# Altium footprint library CADTlink.PcbLib: 143 footprints (part 1 of 9)
Each footprint in its own frame and in the unit in brackets; x right, y up, seen from the top. Pads: shape width x height; smd on the part's side, far side on the other; paste and mask are expansions set on the pad; w line width, h text height; cw(c..) or ccw(c..) is an arc to the next point about the centre after c.
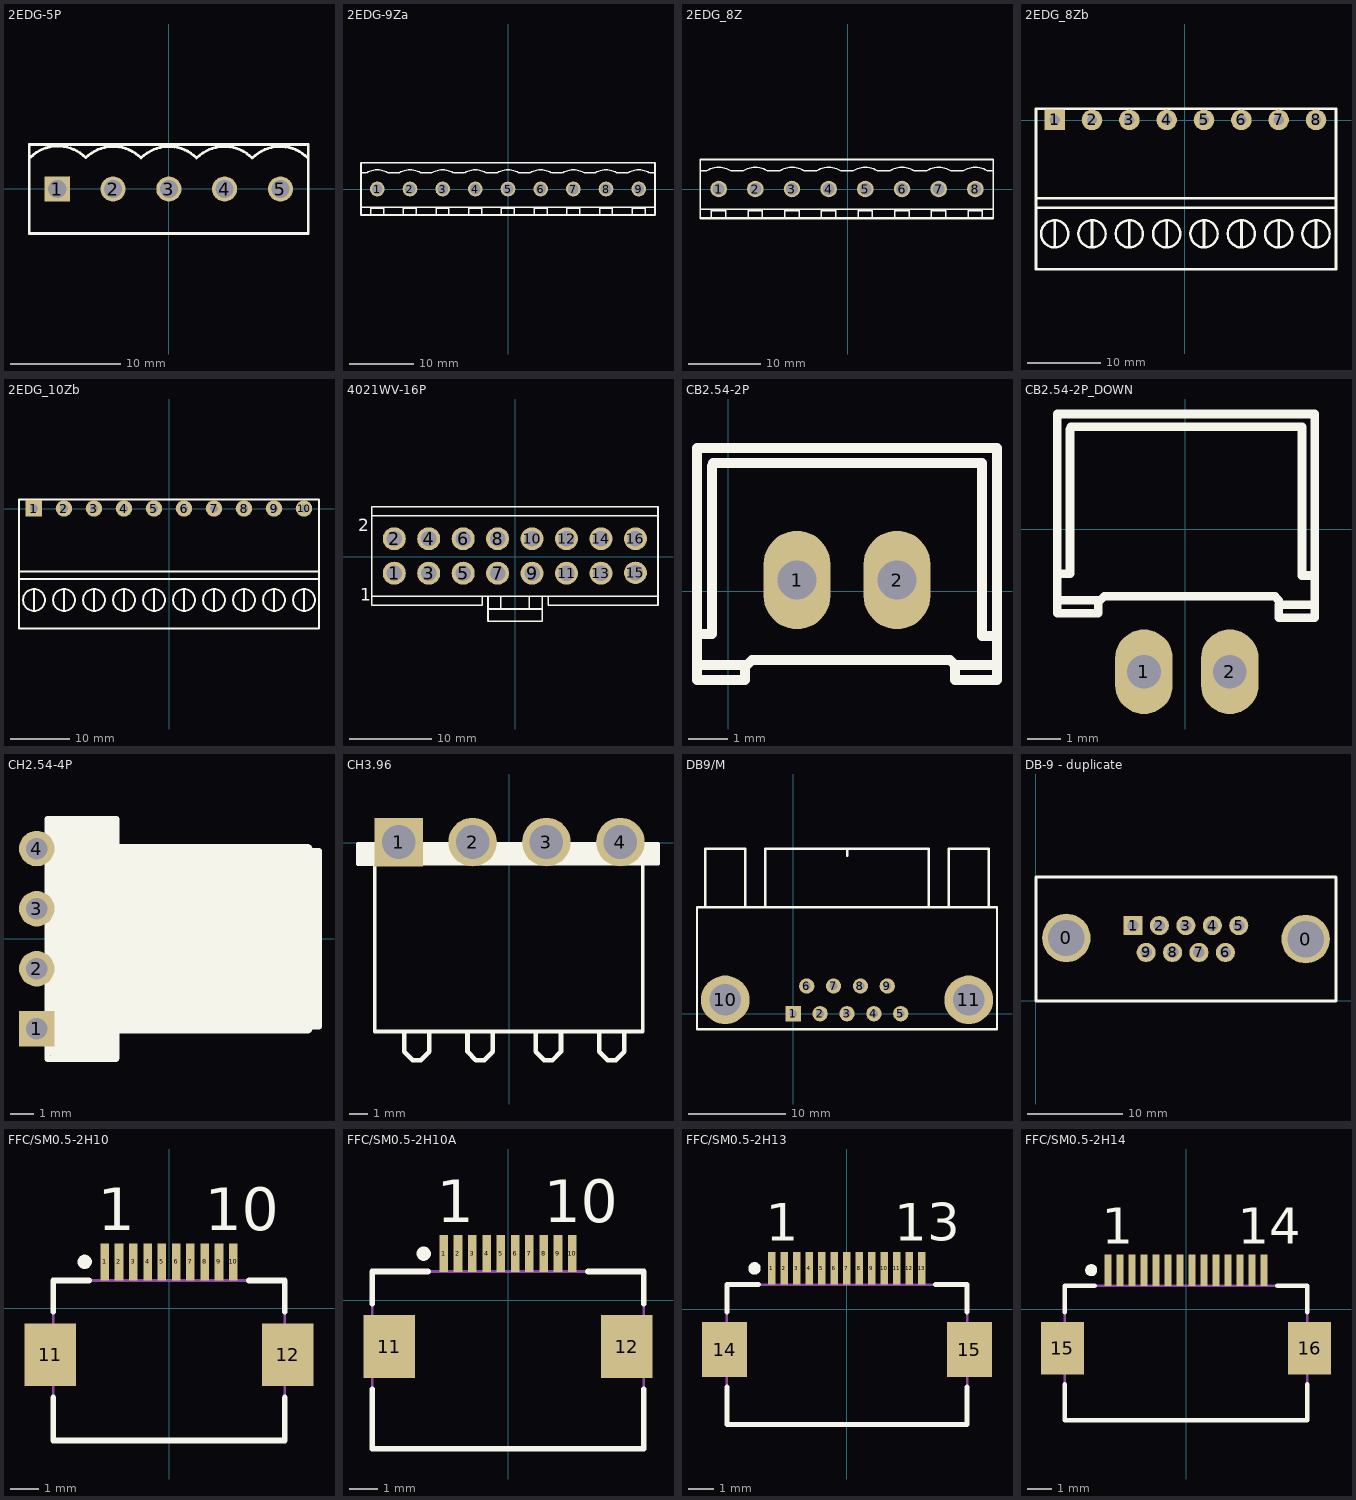
[diagram p0: the footprints below, top view; thin cyan lines are the x and y axes]

## 2EDG-5P [mil]
pads (5):
  rect 90x90 hole 65: 1(-400.22,-0.48)
  round 90 hole 65: 2(-200.22,-0.48) 3(-0.22,-0.48) 4(199.78,-0.48) 5(399.78,-0.48)
Top Overlay:
  lines w10: -495.67,113.59 cw(c-397.83,14.18) -298.43,112.02 ; -297.24,112.02 cw(c-199.41,12.61) -100,110.44 ; -98.03,112.02 cw(c-0.2,12.61) 99.21,110.44 ; 101.18,112.02 cw(c199.02,12.61) 298.43,110.44 ; 300.79,112.02 cw(c398.62,12.61) 498.03,110.44 ; -500.22,-160.48 499.78,-160.48 499.78,159.52 -500.22,159.52 -500.22,-160.48
3D body: height 482.28, standoff -157.48, extent -528.33,-158.69 534.33,161

## 2EDG-9Za [mil]
pads (9):
  round 90 hole 65: 1(-800,0) 2(-600,0) 3(-400,0) 4(-200,0) 5(0,0) 6(200,0) 7(400,0) 8(600,0) 9(800,0)
Top Overlay:
  lines w7.87: -898.42,98.42 -866.93,98.42 ; -865.19,98.49 cw(c-800,0) -734.81,98.49 ; -839.87,-157.44 -839.87,-110.2 ; -839.87,-118.07 -761.13,-118.07 ; -761.13,-157.44 -761.13,-110.2 ; -733.07,98.42 -701.58,98.42 ; -698.42,98.42 -666.93,98.42 ; -665.19,98.49 cw(c-600,0) -534.81,98.49 ; -639.87,-157.44 -639.87,-110.2 ; -639.87,-118.07 -561.13,-118.07 ; -561.13,-157.44 -561.13,-110.2 ; -533.07,98.42 -501.57,98.42 ; -498.43,98.42 -466.93,98.42 ; -465.19,98.49 cw(c-400,0) -334.81,98.49 ; -439.87,-157.44 -439.87,-110.2 ; -439.87,-118.07 -361.13,-118.07 ; -361.13,-157.44 -361.13,-110.2 ; -333.07,98.42 -301.57,98.42 ; -298.43,98.42 -266.93,98.42 ; -265.19,98.49 cw(c-200,0) -134.81,98.49 ; -239.87,-157.44 -239.87,-110.2 ; -239.87,-118.07 -161.13,-118.07 ; -161.13,-157.44 -161.13,-110.2 ; -133.07,98.42 -101.58,98.42 ; -98.42,98.42 -66.93,98.42 ; -65.19,98.49 cw(c0,0) 65.19,98.49 ; -39.87,-157.44 -39.87,-110.2 ; -39.87,-118.07 38.87,-118.07 ; 38.87,-157.44 38.87,-110.2 ; 66.93,98.42 98.42,98.42 ; 101.58,98.42 133.07,98.42 ; 134.81,98.49 cw(c200,0) 265.19,98.49 ; 160.13,-157.44 160.13,-110.2 ; 160.13,-118.07 238.87,-118.07 ; 238.87,-157.44 238.87,-110.2 ; 266.93,98.42 298.43,98.42 ; 301.57,98.42 333.07,98.42 ; 334.81,98.49 cw(c400,0) 465.19,98.49 ; 360.13,-157.44 360.13,-110.2 ; 360.13,-118.07 438.87,-118.07 ; 438.87,-157.44 438.87,-110.2 ; 466.93,98.42 498.43,98.42 ; 501.57,98.42 533.07,98.42 ; 534.81,98.49 cw(c600,0) 665.19,98.49 ; 560.13,-157.44 560.13,-110.2 ; 560.13,-118.07 638.87,-118.07 ; 638.87,-157.44 638.87,-110.2 ; 666.93,98.42 698.42,98.42 ; 701.58,98.42 733.07,98.42 ; 734.81,98.49 cw(c800,0) 865.19,98.49 ; 760.13,-157.44 760.13,-110.2 ; 760.13,-118.07 838.87,-118.07 ; 838.87,-157.44 838.87,-110.2 ; 866.93,98.42 898.42,98.42 ; 899.5,-157.44 699.5,-157.44 499.5,-157.44 299.5,-157.44 99.5,-157.44 -100.5,-157.44 -300.5,-157.44 -500.5,-157.44 -700.5,-157.44 -900.5,-157.44 -900.5,-110.2 -700.5,-110.2 -500.5,-110.2 -300.5,-110.2 -100.5,-110.2 99.5,-110.2 299.5,-110.2 499.5,-110.2 699.5,-110.2 899.5,-110.2
  lines w10: -900,-160 900,-160 900,160 -900,160 -900,-160
3D body: height 482.28, standoff -157.48, extent -933.89,-162.69 927.89,157

## 2EDG_8Z [mil]
pads (8):
  round 90 hole 65: 1(-703,1) 2(-503,1) 3(-303,1) 4(-103,1) 5(97,1) 6(297,1) 7(497,1) 8(697,1)
Top Overlay:
  lines w7.87: -801.42,99.42 -769.93,99.42 ; -768.19,99.49 cw(c-703,1) -637.81,99.49 ; -742.87,-156.44 -742.87,-109.2 ; -742.87,-117.07 -664.13,-117.07 ; -664.13,-156.44 -664.13,-109.2 ; -636.07,99.42 -604.58,99.42 ; -601.42,99.42 -569.93,99.42 ; -568.19,99.49 cw(c-503,1) -437.81,99.49 ; -542.87,-156.44 -542.87,-109.2 ; -542.87,-117.07 -464.13,-117.07 ; -464.13,-156.44 -464.13,-109.2 ; -436.07,99.42 -404.57,99.42 ; -401.43,99.42 -369.93,99.42 ; -368.19,99.49 cw(c-303,1) -237.81,99.49 ; -342.87,-156.44 -342.87,-109.2 ; -342.87,-117.07 -264.13,-117.07 ; -264.13,-156.44 -264.13,-109.2 ; -236.07,99.42 -204.57,99.42 ; -201.43,99.42 -169.93,99.42 ; -168.19,99.49 cw(c-103,1) -37.81,99.49 ; -142.87,-156.44 -142.87,-109.2 ; -142.87,-117.07 -64.13,-117.07 ; -64.13,-156.44 -64.13,-109.2 ; -36.07,99.42 -4.58,99.42 ; -1.43,99.42 30.07,99.42 ; 31.81,99.49 cw(c97,1) 162.19,99.49 ; 57.13,-156.44 57.13,-109.2 ; 57.13,-117.07 135.87,-117.07 ; 135.87,-156.44 135.87,-109.2 ; 163.93,99.42 195.43,99.42 ; 198.57,99.42 230.07,99.42 ; 231.81,99.49 cw(c297,1) 362.19,99.49 ; 257.13,-156.44 257.13,-109.2 ; 257.13,-117.07 335.87,-117.07 ; 335.87,-156.44 335.87,-109.2 ; 363.93,99.42 395.43,99.42 ; 398.57,99.42 430.07,99.42 ; 431.81,99.49 cw(c497,1) 562.19,99.49 ; 457.13,-156.44 457.13,-109.2 ; 457.13,-117.07 535.87,-117.07 ; 535.87,-156.44 535.87,-109.2 ; 563.93,99.42 595.42,99.42 ; 598.58,99.42 630.07,99.42 ; 631.81,99.49 cw(c697,1) 762.19,99.49 ; 657.13,-156.44 657.13,-109.2 ; 657.13,-117.07 735.87,-117.07 ; 735.87,-156.44 735.87,-109.2 ; 763.93,99.42 795.42,99.42 ; 795,-156.44 596.5,-156.44 396.5,-156.44 196.5,-156.44 -3.5,-156.44 -203.5,-156.44 -403.5,-156.44 -603.5,-156.44 -803.5,-156.44 -803.5,-109.2 -603.5,-109.2 -403.5,-109.2 -203.5,-109.2 -3.5,-109.2 196.5,-109.2 396.5,-109.2 596.5,-109.2 796.5,-109.2
  lines w10: 795,-159 -803,-159 -803,161 795,161 795,-156.44

## 2EDG_8Zb [mil]
pads (8):
  rect 110x110 hole 55: 1(-696.24,1.79)
  round 110 hole 55: 2(-496.24,1.79) 3(-296.24,1.79) 4(-96.24,1.79) 5(103.76,1.79) 6(303.76,1.79) 7(503.76,1.79) 8(703.76,1.79)
Bottom Layer:
  lines w19.68: -296.24,1.79 -296.24,36.43
  lines w39.37: -496.24,1.79 -496.24,39.05
Top Overlay:
  circle w13: c703.76,-608.21 r72.8
  circle w13: c503.76,-608.21 r72.8
  circle w13: c303.76,-608.21 r72.8
  circle w13: c103.76,-608.21 r72.8
  circle w13: c-96.24,-608.21 r72.8
  circle w13: c-296.24,-608.21 r72.8
  circle w13: c-496.24,-608.21 r72.8
  circle w13: c-696.24,-608.21 r72.8
  lines w15: -796.24,-468.21 810.76,-468.21 ; -796.24,-418.21 810.76,-418.21 ; -696.24,-673.21 -696.24,-543.21 ; -496.24,-673.21 -496.24,-543.21 ; -296.24,-673.21 -296.24,-543.21 ; -96.24,-673.21 -96.24,-543.21 ; 103.76,-673.21 103.76,-543.21 ; 303.76,-673.21 303.76,-543.21 ; 503.76,-673.21 503.76,-543.21 ; 703.76,-673.21 703.76,-543.21 ; -796.24,-798.21 810.76,-798.21 810.76,61.79 -796.24,61.79 -796.24,-798.21

## 2EDG_10Zb [mil]
pads (10):
  rect 110x110 hole 55: 1(-901.24,1.79)
  round 110 hole 55: 2(-701.24,1.79) 3(-501.24,1.79) 4(-301.24,1.79) 5(-101.24,1.79) 6(98.76,1.79) 7(298.76,1.79) 8(498.76,1.79) 9(698.76,1.79) 10(898.76,1.79)
Top Layer:
  lines w39.37: 698.76,1.79 718.05,1.79
Bottom Layer:
  lines w19.68: -501.24,1.79 -501.24,36.43
  lines w39.37: -701.24,1.79 -701.24,39.05
Top Overlay:
  circle w13: c898.76,-608.21 r72.8
  circle w13: c698.76,-608.21 r72.8
  circle w13: c498.76,-608.21 r72.8
  circle w13: c298.76,-608.21 r72.8
  circle w13: c98.76,-608.21 r72.8
  circle w13: c-101.24,-608.21 r72.8
  circle w13: c-301.24,-608.21 r72.8
  circle w13: c-501.24,-608.21 r72.8
  circle w13: c-701.24,-608.21 r72.8
  circle w13: c-901.24,-608.21 r72.8
  lines w15: -1001.24,-468.21 998.76,-468.21 ; -1001.24,-418.21 998.76,-418.21 ; -901.24,-673.21 -901.24,-543.21 ; -701.24,-673.21 -701.24,-543.21 ; -501.24,-673.21 -501.24,-543.21 ; -301.24,-673.21 -301.24,-543.21 ; -101.24,-673.21 -101.24,-543.21 ; 98.76,-673.21 98.76,-543.21 ; 298.76,-673.21 298.76,-543.21 ; 498.76,-673.21 498.76,-543.21 ; 698.76,-673.21 698.76,-543.21 ; 898.76,-673.21 898.76,-543.21 ; -1001.24,-798.21 998.76,-798.21 998.76,61.79 -1001.24,61.79 -1001.24,-798.21

## 4021WV-16P [mm]
pads (16):
  round 2.8 hole 1.9: 1(-14.721,-2.021) 2(-14.721,2.179) 3(-10.521,-2.021) 4(-10.521,2.179) 5(-6.321,-2.021) 6(-6.321,2.179) 7(-2.121,-2.021) 8(-2.121,2.179) 9(2.079,-2.021) 10(2.079,2.179) 11(6.279,-2.021) 12(6.279,2.179) 13(10.479,-2.021) 14(10.479,2.179) 16(14.679,2.179)
  oval 2.8x2.7 hole 1.9: 15(14.679,-1.971)
Top Overlay:
  lines w0.2: -17.428,-4.821 8.394,-4.821 16.794,-4.821 17.386,-4.821 ; -17.366,4.979 8.14,4.979 16.54,4.979 17.407,4.979 ; -4.012,-4.861 -4.012,-5.54 -4.012,-5.921 -4.687,-5.921 -17.471,-5.921 -17.471,6.079 9.029,6.079 17.429,6.079 17.429,-5.921 9.029,-5.921 4.032,-5.921 ; -3.29,-7.877 -3.29,-4.821 ; -3.29,-6.377 -0.921,-6.377 ; -3.239,-7.877 -0.921,-7.877 3.234,-7.877 ; -1.726,-6.29 -1.726,-5.413 -1.726,-4.908 ; -1.131,-6.377 3.31,-6.377 ; 1.746,-6.377 1.746,-4.821 ; 3.31,-7.877 3.31,-4.821 ; 4.032,-5.838 4.032,-5.54 4.032,-4.865
  text "1" at -18.843,-5.379 h1.52
  text "2" at -19.143,3.121 h1.52

## CB2.54-2P [mm]
pads (2):
  oval 1.7x2.5 hole 1: 1(1.753,0.279) 2(4.293,0.279)
Top Overlay:
  lines w0.254: -0.711,-1.88 0.432,-1.88 ; -0.381,3.2 -0.406,3.175 -0.406,-1.092 -0.787,-1.092 ; -0.381,3.251 6.452,3.251 6.452,-1.143 6.833,-1.143 ; 6.833,-1.803 6.833,-1.143 ; -0.787,-1.092 -0.787,0.279 -0.787,3.632 6.833,3.632 6.833,-1.143 ; -0.787,-1.092 -0.787,-1.88 -0.787,-2.261 0.432,-2.261 0.432,-1.88 ; 0.432,-1.88 0.483,-1.88 0.61,-1.753 5.639,-1.753 5.766,-1.88 ; 5.766,-1.88 6.833,-1.88 6.833,-2.261 5.766,-2.261 5.766,-1.88

## CB2.54-2P_DOWN [mm]
pads (2):
  oval 1.7x2.5 hole 1: 1(-1.219,-4.216) 2(1.321,-4.216)
Top Overlay:
  lines w0.254: -3.708,-2.108 -2.565,-2.108 ; -3.378,2.972 -3.404,2.946 -3.404,-1.321 -3.785,-1.321 ; -3.378,3.023 3.454,3.023 3.454,-1.372 3.835,-1.372 ; -2.388,-1.981 -2.565,-2.159 -2.565,-2.489 -3.785,-2.489 -3.785,-2.108 -3.785,-1.321 ; -2.362,-1.981 2.667,-1.981 ; 2.642,-1.981 2.769,-2.108 ; -3.785,-1.321 -3.785,0.051 -3.785,3.404 3.835,3.404 3.835,-1.372 ; 3.835,-2.235 3.835,-2.616 2.769,-2.616 2.769,-2.235 3.835,-2.235 ; 3.835,-2.235 3.835,-1.372

## CH2.54-4P [mm]
pads (4):
  rect 1.5x1.5 hole 0.9: 1(1.6,-3.81)
  round 1.5 hole 0.9: 2(1.6,-1.27) 3(1.6,1.27) 4(1.6,3.81)
Top Overlay:
  lines w0.254: 2.083,-3.759 2.083,3.861 5.029,3.861 5.029,-3.708 ; 4.953,5.055 2.057,5.055 2.057,-5.08 4.953,-5.08 4.978,-5.055 4.978,5.055 ; 5.029,-3.708 13.538,-3.708 13.538,3.708 5.029,3.708 5.029,-3.708 ; 2.083,-3.658 2.083,3.759 10.592,3.759 10.592,-3.658 2.083,-3.658
  lines w0.4: 2.54,3.81 13.056,3.81 ; 2.591,-3.81 13.056,-3.81
  lines w1: 5.436,1.93 5.436,3.327 ; 5.512,-3.327 5.512,-1.93 ; 5.537,-3.2 6.934,-3.2 ; 5.588,3.277 6.985,3.277 ; 11.252,3.302 12.649,3.302 ; 11.684,-3.251 13.081,-3.251 ; 13.056,1.88 13.056,3.277 ; 13.106,-1.295 13.106,0.102 ; 13.157,-2.87 13.157,-1.473
  lines w1.5: 2.718,-4.42 2.718,4.42 ; 3.632,-4.42 3.632,4.42 ; 4.343,-4.445 4.343,4.394
  lines w5: 7.366,1.321 11.1,1.321 ; 7.391,-1.295 11.125,-1.295 ; 7.595,-1.295 7.595,1.295
3D body: height 7.02, standoff -2.39, extent 1.462,-4.846 12.843,4.834

## CH3.96 [mm]
pads (4):
  rect 2.6x2.6 hole 1.8: 1(-5.939,0.032)
  round 2.6 hole 1.8: 2(-1.979,0.032) 3(1.981,0.032) 4(5.941,0.032)
Top Overlay:
  rectangle: -8.119,-1.128 7.959,-0.051
  lines w0.19: -8.119,-1.169 -8.119,-0.052 7.959,-0.052 7.959,-1.129 7.135,-1.129 -7.175,-1.129 -7.215,-1.169 ; -7.215,-1.192 -7.215,-10.122 7.135,-10.122 7.135,-0.052
  lines w0.193: -8.119,-1.169 -7.215,-1.169
  lines w0.2: -7.103,0.025 -7.103,0.682
  lines w0.254: -5.645,-10.242 -5.645,-11.212 -5.195,-11.662 -4.745,-11.662 -4.295,-11.212 -4.295,-10.242 ; -2.245,-10.242 -2.245,-11.212 -1.795,-11.662 -1.345,-11.662 -0.895,-11.212 -0.895,-10.242 ; 1.405,-10.242 1.405,-11.212 1.855,-11.662 2.305,-11.662 2.755,-11.212 2.755,-10.242 ; 4.805,-10.242 4.805,-11.212 5.255,-11.662 5.705,-11.662 6.155,-11.212 6.155,-10.242
3D body: height 9.58, standoff -2.93, extent -7.993,-15.214 8.007,0.609

## DB9/M [mm]
pads (11):
  rect 1.575x1.575 hole 0.8: 1(0,0)
  round 1.575 hole 0.8: 2(2.76,0) 3(5.52,0) 4(8.28,0) 5(11.04,0) 6(1.38,2.84) 7(4.14,2.84) 8(6.9,2.84) 9(9.66,2.84)
  round 5 hole 3.25: 10(-6.98,1.42) 11(18.02,1.42)
Top Overlay:
  lines w0.254: -9.05,10.92 -9.05,16.92 -4.94,16.92 ; -4.91,10.92 -4.91,16.92 ; -2.85,10.92 -2.85,16.92 13.9,16.92 13.9,10.92 ; 5.525,16.2 5.525,16.9 ; 15.95,10.92 15.95,16.92 20.06,16.92 ; 20.09,10.92 20.09,16.92 ; -9.88,-1.58 -9.88,10.92 20.92,10.92 20.92,-1.58 -9.88,-1.58
3D body: height 12.81, standoff -2.91, extent -9.925,-2.012 20.885,17.063

## DB-9 - duplicate [mm]
pads (11):
  round 5.08 hole 3.8: 0(3.205,6.604) 0(28.275,6.477)
  rect 2x2 hole 1.2: 1(10.19,7.899)
  round 2 hole 1.2: 2(12.958,7.899) 3(15.727,7.899) 4(18.496,7.899) 5(21.264,7.899) 6(19.867,5.08) 7(17.099,5.08) 8(14.33,5.08) 9(11.561,5.08)
Top Overlay:
  lines w0.3: 0.03,0 0.03,12.979 31.45,12.979 31.45,0 0.03,0
3D body: height 11.9, standoff -3.8, extent 0.399,0.229 31.199,12.729

## FFC/SM0.5-2H10 [mm] "Connector; FH12 Series; 10 Position; 0.5mm Spaced Bottom Contact"
height 2
pads (12):
  rect 0.3x1.3 smd: 1(-2.25,1.625) 2(-1.75,1.625) 3(-1.25,1.625) 4(-0.75,1.625) 5(-0.25,1.625) 6(0.25,1.625) 7(0.75,1.625) 8(1.25,1.625) 9(1.75,1.625) 10(2.25,1.625)
  rect 1.8x2.2 smd: 11(-4.15,-1.625) 12(4.15,-1.625)
Top Overlay:
  circle w0.25: c-2.95,1.625 r0.125
  lines w0.2: -4.05,-3.125 -4.05,-4.625 4.05,-4.625 4.05,-3.125 ; -4.05,-0.125 -4.05,0.975 -2.8,0.975 ; 2.8,0.975 4.05,0.975 4.05,-0.125
  text "10" at 1.25,2.725 h1.5
  text "1" at -2.5,2.725 h1.5
Mechanical 13:
  lines w0.1: -4.05,-4.625 -4.05,0.975 4.05,0.975 4.05,-4.625 -4.05,-4.625
3D body: height 2, standoff 0, extent -4.05,-4.625 4.05,0.975

## FFC/SM0.5-2H10A [mm] "Connector; FH12 Series; 10 Position; 0.5mm Spaced Top Contact"
height 2
pads (12):
  rect 0.3x1.3 smd: 1(-2.25,1.625) 2(-1.75,1.625) 3(-1.25,1.625) 4(-0.75,1.625) 5(-0.25,1.625) 6(0.25,1.625) 7(0.75,1.625) 8(1.25,1.625) 9(1.75,1.625) 10(2.25,1.625)
  rect 1.8x2.2 smd: 11(-4.15,-1.625) 12(4.15,-1.625)
Top Overlay:
  circle w0.25: c-2.95,1.625 r0.125
  lines w0.2: -4.75,-3.125 -4.75,-5.2 4.75,-5.2 4.75,-3.125 ; -4.75,-0.125 -4.75,1 -2.8,1 ; 2.8,1 4.75,1 4.75,-0.125
  text "10" at 1.25,2.725 h1.5
  text "1" at -2.5,2.725 h1.5
Mechanical 13:
  lines w0.1: -4.75,-5.2 4.75,-5.2 4.75,1 -4.75,1 -4.75,-5.2
3D body: height 2, standoff 0, extent -4.75,-5.2 4.75,1

## FFC/SM0.5-2H13 [mm] "Connector; FH12 Series; 13 Position; 0.5mm Spaced Bottom Contact"
height 2
pads (15):
  rect 0.3x1.3 smd: 1(-3,1.625) 2(-2.5,1.625) 3(-2,1.625) 4(-1.5,1.625) 5(-1,1.625) 6(-0.5,1.625) 7(0,1.625) 8(0.5,1.625) 9(1,1.625) 10(1.5,1.625) 11(2,1.625) 12(2.5,1.625) 13(3,1.625)
  rect 1.8x2.2 smd: 14(-4.9,-1.625) 15(4.9,-1.625)
Top Overlay:
  circle w0.25: c-3.7,1.625 r0.125
  lines w0.2: -4.8,-3.125 -4.8,-4.625 4.8,-4.625 4.8,-3.125 ; -4.8,-0.125 -4.8,0.975 -3.55,0.975 ; 3.55,0.975 4.8,0.975 4.8,-0.125
  text "13" at 1.9,2.725 h1.5
  text "1" at -3.25,2.725 h1.5
Mechanical 13:
  lines w0.1: -4.8,-4.625 4.8,-4.625 4.8,0.975 -4.8,0.975 -4.8,-4.625
3D body: height 2, standoff 0, extent -4.8,-4.625 4.8,0.975

## FFC/SM0.5-2H14 [mm] "Connector; FH12 Series; 14 Position; 0.5mm Spaced Bottom Contact"
height 2
pads (16):
  rect 0.3x1.3 smd: 1(-3.25,1.625) 2(-2.75,1.625) 3(-2.25,1.625) 4(-1.75,1.625) 5(-1.25,1.625) 6(-0.75,1.625) 7(-0.25,1.625) 8(0.25,1.625) 9(0.75,1.625) 10(1.25,1.625) 11(1.75,1.625) 12(2.25,1.625) 13(2.75,1.625) 14(3.25,1.625)
  rect 1.8x2.2 smd: 15(-5.15,-1.625) 16(5.15,-1.625)
Top Overlay:
  circle w0.25: c-3.95,1.625 r0.125
  lines w0.2: -5.05,-3.125 -5.05,-4.625 5.05,-4.625 5.05,-3.125 ; -5.05,-0.125 -5.05,0.975 -3.8,0.975 ; 3.8,0.975 5.05,0.975 5.05,-0.125
  text "14" at 2.15,2.725 h1.5
  text "1" at -3.5,2.725 h1.5
Mechanical 13:
  lines w0.1: -5.05,-4.625 5.05,-4.625 5.05,0.975 -5.05,0.975 -5.05,-4.625
3D body: height 2, standoff 0, extent -5.05,-4.625 5.05,0.975